# Altium footprint library 封装库.PcbLib: 755 footprints (part 30 of 48)
Each footprint in its own frame and in the unit in brackets; x right, y up, seen from the top. Pads: shape width x height; smd on the part's side, far side on the other; paste and mask are expansions set on the pad; w line width, h text height; cw(c..) or ccw(c..) is an arc to the next point about the centre after c.
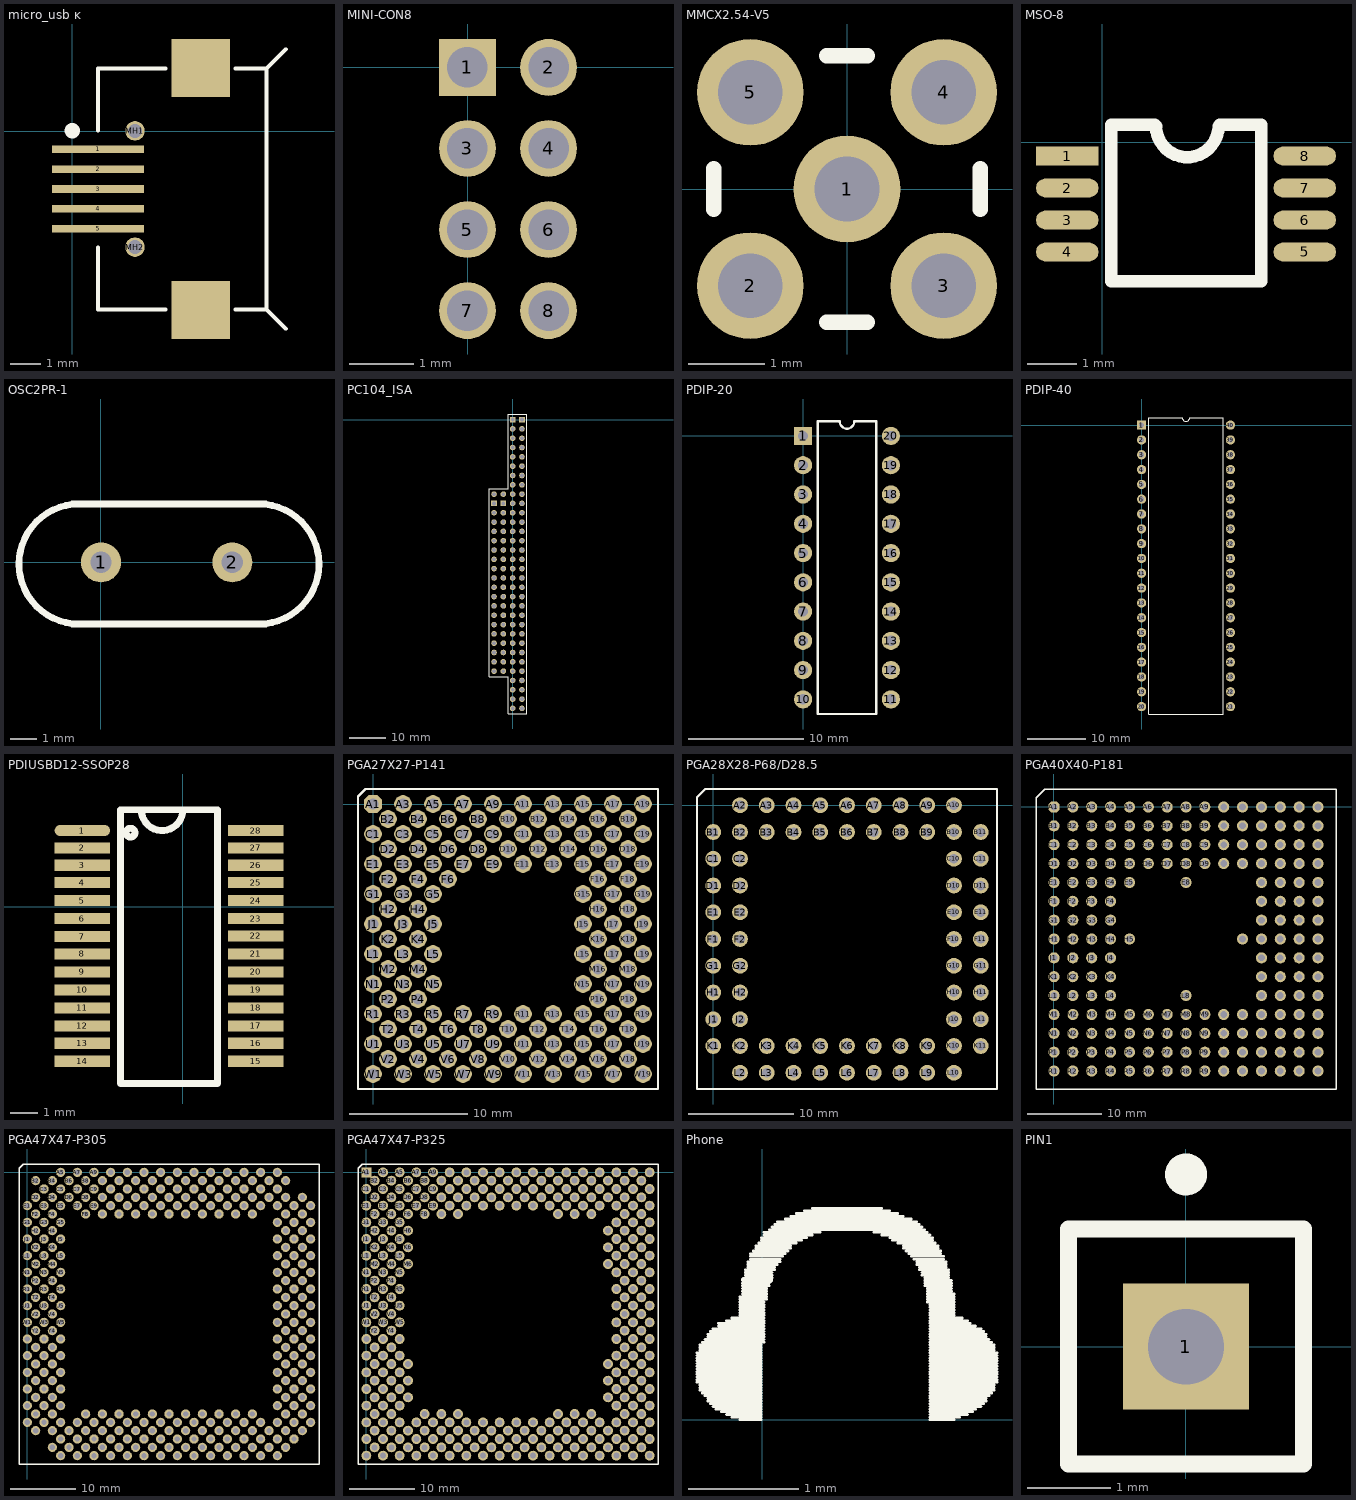
[diagram p29: the footprints below, top view; thin cyan lines are the x and y axes]

## micro_usb ĸ [mm]
pads (9):
  rect 3x0.25 smd: 1(0.842,-0.58) 2(0.842,-1.23) 3(0.842,-1.88) 4(0.842,-2.53) 5(0.842,-3.18)
  round 0.635 hole 0.457 unplated: MH1(2.05,0.02) MH2(2.05,-3.78)
  rect 1.9x1.9 smd: ""(4.2,-5.83) ""(4.2,2.07)
Top Overlay:
  circle w0.25: c0.002,0.025 r0.125
  lines w0.127: 0.842,-5.817 3.048,-5.817 ; 0.842,-5.78 0.842,-3.785 ; 0.842,0.025 0.842,2.02 ; 0.842,2.057 3.048,2.057 ; 5.334,-5.817 6.35,-5.817 6.98,-6.447 ; 5.334,2.057 6.35,2.057 6.98,2.687 ; 6.35,-5.78 6.35,2.02

## MINI-CON8 [mil]
pads (8):
  rect 35x35 hole 25: 1(-0.3,0)
  round 35 hole 25: 2(49.7,0) 3(-0.3,-50) 4(49.7,-50) 5(-0.3,-100) 6(49.7,-100) 7(-0.3,-150) 8(49.7,-150)

## MMCX2.54-V5 [mm] "Connector; RF Coaxial, MMCX, Thru-Hole; 5 Position; Vertical"
height 4.45
pads (5):
  round 1.4 hole 0.85: 1(0,0) 2(-1.27,-1.27) 3(1.27,-1.27) 4(1.27,1.27) 5(-1.27,1.27)
Top Overlay:
  lines w0.2: -1.75,-0.27 -1.75,0.27 ; -0.27,-1.75 0.27,-1.75 ; -0.27,1.75 0.27,1.75 ; 1.75,-0.27 1.75,0.27

## MSO-8 [mil]
pads (8):
  rect 50x15 smd: 1(-28,-11)
  oval 50x15 smd: 2(-28,-36.6) 3(-28,-62.2) 4(-28,-87.8) 5(162,-87.8) 6(162,-62.2) 7(162,-36.6) 8(162,-11)
Top Overlay:
  lines w10: 42,14 7,14 7,-111 127,-111 127,14 94,14 ; 43,13 ccw(c68,13) 93,13

## OSC2PR-1 [mil]
pads (2):
  round 60 hole 32: 1(0.42,-0.46) 2(197.42,-0.46)
Top Overlay:
  lines w10: -42.58,-92.96 247.42,-92.96 ; -42.58,87.04 247.42,87.04 ; -32.58,-92.96 cw(c-32.58,-2.96) -32.58,87.04 ; 237.42,-92.96 ccw(c237.42,-2.96) 237.42,87.04

## PC104_ISA [mil]
pads (104):
  rect 60x60 hole 40: A1(0,0) B1(100,0) C1(-100,-900) D1(-200,-900)
  round 60 hole 40: A2(0,-100) A3(0,-200) A4(0,-300) A5(0,-400) A6(0,-500) A7(0,-600) A8(0,-700) A9(0,-800) A10(0,-900) A11(0,-1000) A12(0,-1100) A13(0,-1200) A14(0,-1300) A15(0,-1400) A16(0,-1500) A17(0,-1600) A18(0,-1700) A19(0,-1800) A20(0,-1900) A21(0,-2000) A22(0,-2100) A23(0,-2200) A24(0,-2300) A25(0,-2400) A26(0,-2500) A27(0,-2600) A28(0,-2700) A29(0,-2800) A30(0,-2900) A31(0,-3000) A32(0,-3100) B2(100,-100) B3(100,-200) B4(100,-300) B5(100,-400) B6(100,-500) B7(100,-600) B8(100,-700) B9(100,-800) B10(100,-900) B11(100,-1000) B12(100,-1100) B13(100,-1200) B14(100,-1300) B15(100,-1400) B16(100,-1500) B17(100,-1600) B18(100,-1700) B19(100,-1800) B20(100,-1900) B21(100,-2000) B22(100,-2100) B23(100,-2200) B24(100,-2300) B25(100,-2400) B26(100,-2500) B27(100,-2600) B28(100,-2700) B29(100,-2800) B30(100,-2900) B31(100,-3000) B32(100,-3100) C0(-100,-800) C2(-100,-1000) C3(-100,-1100) C4(-100,-1200) C5(-100,-1300) C6(-100,-1400) C7(-100,-1500) C8(-100,-1600) C9(-100,-1700) C10(-100,-1800) C11(-100,-1900) C12(-100,-2000) C13(-100,-2100) C14(-100,-2200) C15(-100,-2300) C16(-100,-2400) C17(-100,-2500) C18(-100,-2600) C19(-100,-2700) D0(-200,-800) D2(-200,-1000) D3(-200,-1100) D4(-200,-1200) D5(-200,-1300) D6(-200,-1400) D7(-200,-1500) D8(-200,-1600) D9(-200,-1700) D10(-200,-1800) D11(-200,-1900) D12(-200,-2000) D13(-200,-2100) D14(-200,-2200) D15(-200,-2300) D16(-200,-2400) D17(-200,-2500) D18(-200,-2600) D19(-200,-2700)
Top Overlay:
  lines w10: -250,-2760 -250,-740 -50,-740 -50,60 150,60 150,-3160 -50,-3160 -50,-2760 -250,-2760

## PDIP-20 [mil] "stc"
pads (20):
  rect 62x62 hole 35: 1(0,0)
  round 62 hole 35: 2(0,-100) 3(0,-200) 4(0,-300) 5(0,-400) 6(0,-500) 7(0,-600) 8(0,-700) 9(0,-800) 10(0,-900) 11(300,-900) 12(300,-800) 13(300,-700) 14(300,-600) 15(300,-500) 16(300,-400) 17(300,-300) 18(300,-200) 19(300,-100) 20(300,0)
Top Overlay:
  lines w7.87: 50,-950 250,-950 250,50 175,50 cw(c150,50) 125,50 50,50 50,-950

## PDIP-40 [mil] "stc"
pads (40):
  rect 62x62 hole 35: 1(0,0)
  round 62 hole 35: 2(0,-100) 3(0,-200) 4(0,-300) 5(0,-400) 6(0,-500) 7(0,-600) 8(0,-700) 9(0,-800) 10(0,-900) 11(0,-1000) 12(0,-1100) 13(0,-1200) 14(0,-1300) 15(0,-1400) 16(0,-1500) 17(0,-1600) 18(0,-1700) 19(0,-1800) 20(0,-1900) 21(600,-1900) 22(600,-1800) 23(600,-1700) 24(600,-1600) 25(600,-1500) 26(600,-1400) 27(600,-1300) 28(600,-1200) 29(600,-1100) 30(600,-1000) 31(600,-900) 32(600,-800) 33(600,-700) 34(600,-600) 35(600,-500) 36(600,-400) 37(600,-300) 38(600,-200) 39(600,-100) 40(600,0)
Top Overlay:
  lines w7.87: 50,-1950 550,-1950 550,50 325,50 cw(c300,50) 275,50 50,50 50,-1950

## PDIUSBD12-SSOP28 [mil]
pads (28):
  oval 80x16 smd: 1(-145,110)
  rect 80x16 smd: 2(-145,85) 3(-145,60) 4(-145,35) 5(-145,9) 6(-145,-17) 7(-145,-43) 8(-145,-68) 9(-145,-94) 10(-145,-120) 11(-145,-146) 12(-145,-172) 13(-145,-197) 14(-145,-223) 15(105,-223) 16(105,-197) 17(105,-172) 18(105,-146) 19(105,-120) 20(105,-94) 21(105,-68) 22(105,-42) 23(105,-17) 24(105,9) 25(105,35) 26(105,60) 27(105,85) 28(105,110)
Top Overlay:
  circle w10: c-75.56,106.98 r6.41
  lines w10: -60,140 ccw(c-30,140) 0,140 ; -90,-255 50,-255 50,140 -90,140 -90,-255

## PGA27X27-P141 [mm]
pads (141):
  oct 1.5x1.5 hole 0.9: A1(0,0)
  round 1.5 hole 0.9: A3(2.54,0) A5(5.08,0) A7(7.62,0) A9(10.16,0) A11(12.7,0) A13(15.24,0) A15(17.78,0) A17(20.32,0) A19(22.86,0) B2(1.27,-1.27) B4(3.81,-1.27) B6(6.35,-1.27) B8(8.89,-1.27) B10(11.43,-1.27) B12(13.97,-1.27) B14(16.51,-1.27) B16(19.05,-1.27) B18(21.59,-1.27) C1(0,-2.54) C3(2.54,-2.54) C5(5.08,-2.54) C7(7.62,-2.54) C9(10.16,-2.54) C11(12.7,-2.54) C13(15.24,-2.54) C15(17.78,-2.54) C17(20.32,-2.54) C19(22.86,-2.54) D2(1.27,-3.81) D4(3.81,-3.81) D6(6.35,-3.81) D8(8.89,-3.81) D10(11.43,-3.81) D12(13.97,-3.81) D14(16.51,-3.81) D16(19.05,-3.81) D18(21.59,-3.81) E1(0,-5.08) E3(2.54,-5.08) E5(5.08,-5.08) E7(7.62,-5.08) E9(10.16,-5.08) E11(12.7,-5.08) E13(15.24,-5.08) E15(17.78,-5.08) E17(20.32,-5.08) E19(22.86,-5.08) F2(1.27,-6.35) F4(3.81,-6.35) F6(6.35,-6.35) F16(19.05,-6.35) F18(21.59,-6.35) G1(0,-7.62) G3(2.54,-7.62) G5(5.08,-7.62) G15(17.78,-7.62) G17(20.32,-7.62) G19(22.86,-7.62) H2(1.27,-8.89) H4(3.81,-8.89) H16(19.05,-8.89) H18(21.59,-8.89) J1(0,-10.16) J3(2.54,-10.16) J5(5.08,-10.16) J15(17.78,-10.16) J17(20.32,-10.16) J19(22.86,-10.16) K2(1.27,-11.43) K4(3.81,-11.43) K16(19.05,-11.43) K18(21.59,-11.43) L1(0,-12.7) L3(2.54,-12.7) L5(5.08,-12.7) L15(17.78,-12.7) L17(20.32,-12.7) L19(22.86,-12.7) M2(1.27,-13.97) M4(3.81,-13.97) M16(19.05,-13.97) M18(21.59,-13.97) N1(0,-15.24) N3(2.54,-15.24) N5(5.08,-15.24) N15(17.78,-15.24) N17(20.32,-15.24) N19(22.86,-15.24) P2(1.27,-16.51) P4(3.81,-16.51) P16(19.05,-16.51) P18(21.59,-16.51) R1(0,-17.78) R3(2.54,-17.78) R5(5.08,-17.78) R7(7.62,-17.78) R9(10.16,-17.78) R11(12.7,-17.78) R13(15.24,-17.78) R15(17.78,-17.78) R17(20.32,-17.78) R19(22.86,-17.78) T2(1.27,-19.05) T4(3.81,-19.05) T6(6.35,-19.05) T8(8.89,-19.05) T10(11.43,-19.05) T12(13.97,-19.05) T14(16.51,-19.05) T16(19.05,-19.05) T18(21.59,-19.05) U1(0,-20.32) U3(2.54,-20.32) U5(5.08,-20.32) U7(7.62,-20.32) U9(10.16,-20.32) U11(12.7,-20.32) U13(15.24,-20.32) U15(17.78,-20.32) U17(20.32,-20.32) U19(22.86,-20.32) V2(1.27,-21.59) V4(3.81,-21.59) V6(6.35,-21.59) V8(8.89,-21.59) V10(11.43,-21.59) V12(13.97,-21.59) V14(16.51,-21.59) V16(19.05,-21.59) V18(21.59,-21.59) W1(0,-22.86) W3(2.54,-22.86) W5(5.08,-22.86) W7(7.62,-22.86) W9(10.16,-22.86) W11(12.7,-22.86) W13(15.24,-22.86) W15(17.78,-22.86) W17(20.32,-22.86) W19(22.86,-22.86)
Top Overlay:
  lines w0.2: -1.27,-24.13 -1.27,0.635 -0.635,1.27 24.13,1.27 24.13,-24.13 -1.27,-24.13

## PGA28X28-P68/D28.5 [mm]
pads (68):
  round 1.5 hole 0.9: A2(2.54,0) A3(5.08,0) A4(7.62,0) A5(10.16,0) A6(12.7,0) A7(15.24,0) A8(17.78,0) A9(20.32,0) A10(22.86,0) B1(0,-2.54) B2(2.54,-2.54) B3(5.08,-2.54) B4(7.62,-2.54) B5(10.16,-2.54) B6(12.7,-2.54) B7(15.24,-2.54) B8(17.78,-2.54) B9(20.32,-2.54) B10(22.86,-2.54) B11(25.4,-2.54) C1(0,-5.08) C2(2.54,-5.08) C10(22.86,-5.08) C11(25.4,-5.08) D1(0,-7.62) D2(2.54,-7.62) D10(22.86,-7.62) D11(25.4,-7.62) E1(0,-10.16) E2(2.54,-10.16) E10(22.86,-10.16) E11(25.4,-10.16) F1(0,-12.7) F2(2.54,-12.7) F10(22.86,-12.7) F11(25.4,-12.7) G1(0,-15.24) G2(2.54,-15.24) G10(22.86,-15.24) G11(25.4,-15.24) H1(0,-17.78) H2(2.54,-17.78) H10(22.86,-17.78) H11(25.4,-17.78) J1(0,-20.32) J2(2.54,-20.32) J10(22.86,-20.32) J11(25.4,-20.32) K1(0,-22.86) K2(2.54,-22.86) K3(5.08,-22.86) K4(7.62,-22.86) K5(10.16,-22.86) K6(12.7,-22.86) K7(15.24,-22.86) K8(17.78,-22.86) K9(20.32,-22.86) K10(22.86,-22.86) K11(25.4,-22.86) L2(2.54,-25.4) L3(5.08,-25.4) L4(7.62,-25.4) L5(10.16,-25.4) L6(12.7,-25.4) L7(15.24,-25.4) L8(17.78,-25.4) L9(20.32,-25.4) L10(22.86,-25.4)
Top Overlay:
  lines w0.2: -1.55,-26.95 -1.55,0.775 -0.775,1.55 26.95,1.55 26.95,-26.95 -1.55,-26.95

## PGA40X40-P181 [mm]
pads (181):
  oct 1.5x1.5 hole 0.9: A1(0,0)
  round 1.5 hole 0.9: A2(2.54,0) A3(5.08,0) A4(7.62,0) A5(10.16,0) A6(12.7,0) A7(15.24,0) A8(17.78,0) A9(20.32,0) A10(22.86,0) A11(25.4,0) A12(27.94,0) A13(30.48,0) A14(33.02,0) A15(35.56,0) B1(0,-2.54) B2(2.54,-2.54) B3(5.08,-2.54) B4(7.62,-2.54) B5(10.16,-2.54) B6(12.7,-2.54) B7(15.24,-2.54) B8(17.78,-2.54) B9(20.32,-2.54) B10(22.86,-2.54) B11(25.4,-2.54) B12(27.94,-2.54) B13(30.48,-2.54) B14(33.02,-2.54) B15(35.56,-2.54) C1(0,-5.08) C2(2.54,-5.08) C3(5.08,-5.08) C4(7.62,-5.08) C5(10.16,-5.08) C6(12.7,-5.08) C7(15.24,-5.08) C8(17.78,-5.08) C9(20.32,-5.08) C10(22.86,-5.08) C11(25.4,-5.08) C12(27.94,-5.08) C13(30.48,-5.08) C14(33.02,-5.08) C15(35.56,-5.08) D1(0,-7.62) D2(2.54,-7.62) D3(5.08,-7.62) D4(7.62,-7.62) D5(10.16,-7.62) D6(12.7,-7.62) D7(15.24,-7.62) D8(17.78,-7.62) D9(20.32,-7.62) D10(22.86,-7.62) D11(25.4,-7.62) D12(27.94,-7.62) D13(30.48,-7.62) D14(33.02,-7.62) D15(35.56,-7.62) E1(0,-10.16) E2(2.54,-10.16) E3(5.08,-10.16) E4(7.62,-10.16) E5(10.16,-10.16) E8(17.78,-10.16) E12(27.94,-10.16) E13(30.48,-10.16) E14(33.02,-10.16) E15(35.56,-10.16) F1(0,-12.7) F2(2.54,-12.7) F3(5.08,-12.7) F4(7.62,-12.7) F12(27.94,-12.7) F13(30.48,-12.7) F14(33.02,-12.7) F15(35.56,-12.7) G1(0,-15.24) G2(2.54,-15.24) G3(5.08,-15.24) G4(7.62,-15.24) G12(27.94,-15.24) G13(30.48,-15.24) G14(33.02,-15.24) G15(35.56,-15.24) H1(0,-17.78) H2(2.54,-17.78) H3(5.08,-17.78) H4(7.62,-17.78) H5(10.16,-17.78) H11(25.4,-17.78) H12(27.94,-17.78) H13(30.48,-17.78) H14(33.02,-17.78) H15(35.56,-17.78) J1(0,-20.32) J2(2.54,-20.32) J3(5.08,-20.32) J4(7.62,-20.32) J12(27.94,-20.32) J13(30.48,-20.32) J14(33.02,-20.32) J15(35.56,-20.32) K1(0,-22.86) K2(2.54,-22.86) K3(5.08,-22.86) K4(7.62,-22.86) K12(27.94,-22.86) K13(30.48,-22.86) K14(33.02,-22.86) K15(35.56,-22.86) L1(0,-25.4) L2(2.54,-25.4) L3(5.08,-25.4) L4(7.62,-25.4) L8(17.78,-25.4) L12(27.94,-25.4) L13(30.48,-25.4) L14(33.02,-25.4) L15(35.56,-25.4) M1(0,-27.94) M2(2.54,-27.94) M3(5.08,-27.94) M4(7.62,-27.94) M5(10.16,-27.94) M6(12.7,-27.94) M7(15.24,-27.94) M8(17.78,-27.94) M9(20.32,-27.94) M10(22.86,-27.94) M11(25.4,-27.94) M12(27.94,-27.94) M13(30.48,-27.94) M14(33.02,-27.94) M15(35.56,-27.94) N1(0,-30.48) N2(2.54,-30.48) N3(5.08,-30.48) N4(7.62,-30.48) N5(10.16,-30.48) N6(12.7,-30.48) N7(15.24,-30.48) N8(17.78,-30.48) N9(20.32,-30.48) N10(22.86,-30.48) N11(25.4,-30.48) N12(27.94,-30.48) N13(30.48,-30.48) N14(33.02,-30.48) N15(35.56,-30.48) P1(0,-33.02) P2(2.54,-33.02) P3(5.08,-33.02) P4(7.62,-33.02) P5(10.16,-33.02) P6(12.7,-33.02) P7(15.24,-33.02) P8(17.78,-33.02) P9(20.32,-33.02) P10(22.86,-33.02) P11(25.4,-33.02) P12(27.94,-33.02) P13(30.48,-33.02) P14(33.02,-33.02) P15(35.56,-33.02) R1(0,-35.56) R2(2.54,-35.56) R3(5.08,-35.56) R4(7.62,-35.56) R5(10.16,-35.56) R6(12.7,-35.56) R7(15.24,-35.56) R8(17.78,-35.56) R9(20.32,-35.56) R10(22.86,-35.56) R11(25.4,-35.56) R12(27.94,-35.56) R13(30.48,-35.56) R14(33.02,-35.56) R15(35.56,-35.56)
Top Overlay:
  lines w0.2: -2.42,-37.98 -2.42,1.21 -1.21,2.42 37.98,2.42 37.98,-37.98 -2.42,-37.98

## PGA47X47-P305 [mm]
pads (305):
  round 1.4 hole 0.8: A5(5.08,0) A7(7.62,0) A9(10.16,0) A11(12.7,0) A13(15.24,0) A15(17.78,0) A17(20.32,0) A19(22.86,0) A21(25.4,0) A23(27.94,0) A25(30.48,0) A27(33.02,0) A29(35.56,0) A31(38.1,0) AA1(0,-25.4) AA3(2.54,-25.4) AA5(5.08,-25.4) AA31(38.1,-25.4) AA33(40.64,-25.4) AA35(43.18,-25.4) AB2(1.27,-26.67) AB4(3.81,-26.67) AB32(39.37,-26.67) AB34(41.91,-26.67) AC1(0,-27.94) AC3(2.54,-27.94) AC5(5.08,-27.94) AC31(38.1,-27.94) AC33(40.64,-27.94) AC35(43.18,-27.94) AD2(1.27,-29.21) AD4(3.81,-29.21) AD32(39.37,-29.21) AD34(41.91,-29.21) AE1(0,-30.48) AE3(2.54,-30.48) AE5(5.08,-30.48) AE31(38.1,-30.48) AE33(40.64,-30.48) AE35(43.18,-30.48) AF2(1.27,-31.75) AF4(3.81,-31.75) AF32(39.37,-31.75) AF34(41.91,-31.75) AG1(0,-33.02) AG3(2.54,-33.02) AG5(5.08,-33.02) AG31(38.1,-33.02) AG33(40.64,-33.02) AG35(43.18,-33.02) AH2(1.27,-34.29) AH4(3.81,-34.29) AH32(39.37,-34.29) AH34(41.91,-34.29) AJ1(0,-35.56) AJ3(2.54,-35.56) AJ5(5.08,-35.56) AJ31(38.1,-35.56) AJ33(40.64,-35.56) AJ35(43.18,-35.56) AK2(1.27,-36.83) AK4(3.81,-36.83) AK8(8.89,-36.83) AK10(11.43,-36.83) AK12(13.97,-36.83) AK14(16.51,-36.83) AK16(19.05,-36.83) AK18(21.59,-36.83) AK20(24.13,-36.83) AK22(26.67,-36.83) AK24(29.21,-36.83) AK26(31.75,-36.83) AK28(34.29,-36.83) AK32(39.37,-36.83) AK34(41.91,-36.83) AL1(0,-38.1) AL3(2.54,-38.1) AL5(5.08,-38.1) AL7(7.62,-38.1) AL9(10.16,-38.1) AL11(12.7,-38.1) AL13(15.24,-38.1) AL15(17.78,-38.1) AL17(20.32,-38.1) AL19(22.86,-38.1) AL21(25.4,-38.1) AL23(27.94,-38.1) AL25(30.48,-38.1) AL27(33.02,-38.1) AL29(35.56,-38.1) AL31(38.1,-38.1) AL33(40.64,-38.1) AL35(43.18,-38.1) AM2(1.27,-39.37) AM4(3.81,-39.37) AM6(6.35,-39.37) AM8(8.89,-39.37) AM10(11.43,-39.37) AM12(13.97,-39.37) AM14(16.51,-39.37) AM16(19.05,-39.37) AM18(21.59,-39.37) AM20(24.13,-39.37) AM22(26.67,-39.37) AM24(29.21,-39.37) AM26(31.75,-39.37) AM28(34.29,-39.37) AM30(36.83,-39.37) AM32(39.37,-39.37) AM34(41.91,-39.37) AN5(5.08,-40.64) AN7(7.62,-40.64) AN9(10.16,-40.64) AN11(12.7,-40.64) AN13(15.24,-40.64) AN15(17.78,-40.64) AN17(20.32,-40.64) AN19(22.86,-40.64) AN21(25.4,-40.64) AN23(27.94,-40.64) AN25(30.48,-40.64) AN27(33.02,-40.64) AN29(35.56,-40.64) AN31(38.1,-40.64) AN33(40.64,-40.64) AP4(3.81,-41.91) AP6(6.35,-41.91) AP8(8.89,-41.91) AP10(11.43,-41.91) AP12(13.97,-41.91) AP14(16.51,-41.91) AP16(19.05,-41.91) AP18(21.59,-41.91) AP20(24.13,-41.91) AP22(26.67,-41.91) AP24(29.21,-41.91) AP26(31.75,-41.91) AP28(34.29,-41.91) AP30(36.83,-41.91) AP32(39.37,-41.91) AR5(5.08,-43.18) AR7(7.62,-43.18) AR9(10.16,-43.18) AR11(12.7,-43.18) AR13(15.24,-43.18) AR15(17.78,-43.18) AR17(20.32,-43.18) AR19(22.86,-43.18) AR21(25.4,-43.18) AR23(27.94,-43.18) AR25(30.48,-43.18) AR27(33.02,-43.18) AR29(35.56,-43.18) AR31(38.1,-43.18) B2(1.27,-1.27) B4(3.81,-1.27) B6(6.35,-1.27) B8(8.89,-1.27) B10(11.43,-1.27) B12(13.97,-1.27) B14(16.51,-1.27) B16(19.05,-1.27) B18(21.59,-1.27) B20(24.13,-1.27) B22(26.67,-1.27) B24(29.21,-1.27) B26(31.75,-1.27) B28(34.29,-1.27) B30(36.83,-1.27) B32(39.37,-1.27) C3(2.54,-2.54) C5(5.08,-2.54) C7(7.62,-2.54) C9(10.16,-2.54) C11(12.7,-2.54) C13(15.24,-2.54) C15(17.78,-2.54) C17(20.32,-2.54) C19(22.86,-2.54) C21(25.4,-2.54) C23(27.94,-2.54) C25(30.48,-2.54) C27(33.02,-2.54) C29(35.56,-2.54) C31(38.1,-2.54) D2(1.27,-3.81) D4(3.81,-3.81) D6(6.35,-3.81) D8(8.89,-3.81) D10(11.43,-3.81) D12(13.97,-3.81) D14(16.51,-3.81) D16(19.05,-3.81) D18(21.59,-3.81) D20(24.13,-3.81) D22(26.67,-3.81) D24(29.21,-3.81) D26(31.75,-3.81) D28(34.29,-3.81) D30(36.83,-3.81) D32(39.37,-3.81) D34(41.91,-3.81) E1(0,-5.08) E3(2.54,-5.08) E5(5.08,-5.08) E7(7.62,-5.08) E9(10.16,-5.08) E11(12.7,-5.08) E13(15.24,-5.08) E15(17.78,-5.08) E17(20.32,-5.08) E19(22.86,-5.08) E21(25.4,-5.08) E23(27.94,-5.08) E25(30.48,-5.08) E27(33.02,-5.08) E29(35.56,-5.08) E31(38.1,-5.08) E33(40.64,-5.08) E35(43.18,-5.08) F2(1.27,-6.35) F4(3.81,-6.35) F8(8.89,-6.35) F10(11.43,-6.35) F12(13.97,-6.35) F14(16.51,-6.35) F16(19.05,-6.35) F18(21.59,-6.35) F20(24.13,-6.35) F22(26.67,-6.35) F24(29.21,-6.35) F26(31.75,-6.35) F28(34.29,-6.35) F32(39.37,-6.35) F34(41.91,-6.35) G1(0,-7.62) G3(2.54,-7.62) G5(5.08,-7.62) G31(38.1,-7.62) G33(40.64,-7.62) G35(43.18,-7.62) H2(1.27,-8.89) H4(3.81,-8.89) H32(39.37,-8.89) H34(41.91,-8.89) J1(0,-10.16) J3(2.54,-10.16) J5(5.08,-10.16) J31(38.1,-10.16) J33(40.64,-10.16) J35(43.18,-10.16) K2(1.27,-11.43) K4(3.81,-11.43) K32(39.37,-11.43) K34(41.91,-11.43) L1(0,-12.7) L3(2.54,-12.7) L5(5.08,-12.7) L31(38.1,-12.7) L33(40.64,-12.7) L35(43.18,-12.7) M2(1.27,-13.97) M4(3.81,-13.97) M32(39.37,-13.97) M34(41.91,-13.97) N1(0,-15.24) N3(2.54,-15.24) N5(5.08,-15.24) N31(38.1,-15.24) N33(40.64,-15.24) N35(43.18,-15.24) P2(1.27,-16.51) P4(3.81,-16.51) P32(39.37,-16.51) P34(41.91,-16.51) R1(0,-17.78) R3(2.54,-17.78) R5(5.08,-17.78) R31(38.1,-17.78) R33(40.64,-17.78) R35(43.18,-17.78) T2(1.27,-19.05) T4(3.81,-19.05) T32(39.37,-19.05) T34(41.91,-19.05) U1(0,-20.32) U3(2.54,-20.32) U5(5.08,-20.32) U31(38.1,-20.32) U33(40.64,-20.32) U35(43.18,-20.32) V2(1.27,-21.59) V4(3.81,-21.59) V32(39.37,-21.59) V34(41.91,-21.59) W1(0,-22.86) W3(2.54,-22.86) W5(5.08,-22.86) W31(38.1,-22.86) W33(40.64,-22.86) W35(43.18,-22.86) Y2(1.27,-24.13) Y4(3.81,-24.13) Y32(39.37,-24.13) Y34(41.91,-24.13)
Top Overlay:
  lines w0.2: -1.27,-44.45 -1.27,0.635 -0.635,1.27 44.45,1.27 44.45,-44.45 -1.27,-44.45

## PGA47X47-P325 [mm]
pads (325):
  rect 1.5x1.5 hole 0.9: A1(0,0)
  round 1.5 hole 0.9: A3(2.54,0) A5(5.08,0) A7(7.62,0) A9(10.16,0) A11(12.7,0) A13(15.24,0) A15(17.78,0) A17(20.32,0) A19(22.86,0) A21(25.4,0) A23(27.94,0) A25(30.48,0) A27(33.02,0) A29(35.56,0) A31(38.1,0) A33(40.64,0) A35(43.18,0) AA1(0,-25.4) AA3(2.54,-25.4) AA5(5.08,-25.4) AA31(38.1,-25.4) AA33(40.64,-25.4) AA35(43.18,-25.4) AB2(1.27,-26.67) AB4(3.81,-26.67) AB32(39.37,-26.67) AB34(41.91,-26.67) AC1(0,-27.94) AC3(2.54,-27.94) AC5(5.08,-27.94) AC31(38.1,-27.94) AC33(40.64,-27.94) AC35(43.18,-27.94) AD2(1.27,-29.21) AD4(3.81,-29.21) AD6(6.35,-29.21) AD30(36.83,-29.21) AD32(39.37,-29.21) AD34(41.91,-29.21) AE1(0,-30.48) AE3(2.54,-30.48) AE5(5.08,-30.48) AE31(38.1,-30.48) AE33(40.64,-30.48) AE35(43.18,-30.48) AF2(1.27,-31.75) AF4(3.81,-31.75) AF6(6.35,-31.75) AF30(36.83,-31.75) AF32(39.37,-31.75) AF34(41.91,-31.75) AG1(0,-33.02) AG3(2.54,-33.02) AG5(5.08,-33.02) AG31(38.1,-33.02) AG33(40.64,-33.02) AG35(43.18,-33.02) AH2(1.27,-34.29) AH4(3.81,-34.29) AH6(6.35,-34.29) AH30(36.83,-34.29) AH32(39.37,-34.29) AH34(41.91,-34.29) AJ1(0,-35.56) AJ3(2.54,-35.56) AJ5(5.08,-35.56) AJ31(38.1,-35.56) AJ33(40.64,-35.56) AJ35(43.18,-35.56) AK2(1.27,-36.83) AK4(3.81,-36.83) AK8(8.89,-36.83) AK10(11.43,-36.83) AK12(13.97,-36.83) AK24(29.21,-36.83) AK26(31.75,-36.83) AK28(34.29,-36.83) AK32(39.37,-36.83) AK34(41.91,-36.83) AL1(0,-38.1) AL3(2.54,-38.1) AL5(5.08,-38.1) AL7(7.62,-38.1) AL9(10.16,-38.1) AL11(12.7,-38.1) AL13(15.24,-38.1) AL15(17.78,-38.1) AL17(20.32,-38.1) AL19(22.86,-38.1) AL21(25.4,-38.1) AL23(27.94,-38.1) AL25(30.48,-38.1) AL27(33.02,-38.1) AL29(35.56,-38.1) AL31(38.1,-38.1) AL33(40.64,-38.1) AL35(43.18,-38.1) AM2(1.27,-39.37) AM4(3.81,-39.37) AM6(6.35,-39.37) AM8(8.89,-39.37) AM10(11.43,-39.37) AM12(13.97,-39.37) AM14(16.51,-39.37) AM16(19.05,-39.37) AM18(21.59,-39.37) AM20(24.13,-39.37) AM22(26.67,-39.37) AM24(29.21,-39.37) AM26(31.75,-39.37) AM28(34.29,-39.37) AM30(36.83,-39.37) AM32(39.37,-39.37) AM34(41.91,-39.37) AN1(0,-40.64) AN3(2.54,-40.64) AN5(5.08,-40.64) AN7(7.62,-40.64) AN9(10.16,-40.64) AN11(12.7,-40.64) AN13(15.24,-40.64) AN15(17.78,-40.64) AN17(20.32,-40.64) AN19(22.86,-40.64) AN21(25.4,-40.64) AN23(27.94,-40.64) AN25(30.48,-40.64) AN27(33.02,-40.64) AN29(35.56,-40.64) AN31(38.1,-40.64) AN33(40.64,-40.64) AN35(43.18,-40.64) AP2(1.27,-41.91) AP4(3.81,-41.91) AP6(6.35,-41.91) AP8(8.89,-41.91) AP10(11.43,-41.91) AP12(13.97,-41.91) AP14(16.51,-41.91) AP16(19.05,-41.91) AP18(21.59,-41.91) AP20(24.13,-41.91) AP22(26.67,-41.91) AP24(29.21,-41.91) AP26(31.75,-41.91) AP28(34.29,-41.91) AP30(36.83,-41.91) AP32(39.37,-41.91) AP34(41.91,-41.91) AR1(0,-43.18) AR3(2.54,-43.18) AR5(5.08,-43.18) AR7(7.62,-43.18) AR9(10.16,-43.18) AR11(12.7,-43.18) AR13(15.24,-43.18) AR15(17.78,-43.18) AR17(20.32,-43.18) AR19(22.86,-43.18) AR21(25.4,-43.18) AR23(27.94,-43.18) AR25(30.48,-43.18) AR27(33.02,-43.18) AR29(35.56,-43.18) AR31(38.1,-43.18) AR33(40.64,-43.18) AR35(43.18,-43.18) B2(1.27,-1.27) B4(3.81,-1.27) B6(6.35,-1.27) B8(8.89,-1.27) B10(11.43,-1.27) B12(13.97,-1.27) B14(16.51,-1.27) B16(19.05,-1.27) B18(21.59,-1.27) B20(24.13,-1.27) B22(26.67,-1.27) B24(29.21,-1.27) B26(31.75,-1.27) B28(34.29,-1.27) B30(36.83,-1.27) B32(39.37,-1.27) B34(41.91,-1.27) C1(0,-2.54) C3(2.54,-2.54) C5(5.08,-2.54) C7(7.62,-2.54) C9(10.16,-2.54) C11(12.7,-2.54) C13(15.24,-2.54) C15(17.78,-2.54) C17(20.32,-2.54) C19(22.86,-2.54) C21(25.4,-2.54) C23(27.94,-2.54) C25(30.48,-2.54) C27(33.02,-2.54) C29(35.56,-2.54) C31(38.1,-2.54) C33(40.64,-2.54) C35(43.18,-2.54) D2(1.27,-3.81) D4(3.81,-3.81) D6(6.35,-3.81) D8(8.89,-3.81) D10(11.43,-3.81) D12(13.97,-3.81) D14(16.51,-3.81) D16(19.05,-3.81) D18(21.59,-3.81) D20(24.13,-3.81) D22(26.67,-3.81) D24(29.21,-3.81) D26(31.75,-3.81) D28(34.29,-3.81) D30(36.83,-3.81) D32(39.37,-3.81) D34(41.91,-3.81) E1(0,-5.08) E3(2.54,-5.08) E5(5.08,-5.08) E7(7.62,-5.08) E9(10.16,-5.08) E11(12.7,-5.08) E13(15.24,-5.08) E15(17.78,-5.08) E17(20.32,-5.08) E19(22.86,-5.08) E21(25.4,-5.08) E23(27.94,-5.08) E25(30.48,-5.08) E27(33.02,-5.08) E29(35.56,-5.08) E31(38.1,-5.08) E33(40.64,-5.08) E35(43.18,-5.08) F2(1.27,-6.35) F4(3.81,-6.35) F6(6.35,-6.35) F8(8.89,-6.35) F10(11.43,-6.35) F12(13.97,-6.35) F24(29.21,-6.35) F26(31.75,-6.35) F28(34.29,-6.35) F32(39.37,-6.35) F34(41.91,-6.35) G1(0,-7.62) G3(2.54,-7.62) G5(5.08,-7.62) G31(38.1,-7.62) G33(40.64,-7.62) G35(43.18,-7.62) H2(1.27,-8.89) H4(3.81,-8.89) H6(6.35,-8.89) H30(36.83,-8.89) H32(39.37,-8.89) H34(41.91,-8.89) J1(0,-10.16) J3(2.54,-10.16) J5(5.08,-10.16) J31(38.1,-10.16) J33(40.64,-10.16) J35(43.18,-10.16) K2(1.27,-11.43) K4(3.81,-11.43) K6(6.35,-11.43) K30(36.83,-11.43) K32(39.37,-11.43) K34(41.91,-11.43) L1(0,-12.7) L3(2.54,-12.7) L5(5.08,-12.7) L31(38.1,-12.7) L33(40.64,-12.7) L35(43.18,-12.7) M2(1.27,-13.97) M4(3.81,-13.97) M6(6.35,-13.97) M30(36.83,-13.97) M32(39.37,-13.97) M34(41.91,-13.97) N1(0,-15.24) N3(2.54,-15.24) N5(5.08,-15.24) N31(38.1,-15.24) N33(40.64,-15.24) N35(43.18,-15.24) P2(1.27,-16.51) P4(3.81,-16.51) P32(39.37,-16.51) P34(41.91,-16.51) R1(0,-17.78) R3(2.54,-17.78) R5(5.08,-17.78) R31(38.1,-17.78) R33(40.64,-17.78) R35(43.18,-17.78) T2(1.27,-19.05) T4(3.81,-19.05) T32(39.37,-19.05) T34(41.91,-19.05) U1(0,-20.32) U3(2.54,-20.32) U5(5.08,-20.32) U31(38.1,-20.32) U33(40.64,-20.32) U35(43.18,-20.32) V2(1.27,-21.59) V4(3.81,-21.59) V32(39.37,-21.59) V34(41.91,-21.59) W1(0,-22.86) W3(2.54,-22.86) W5(5.08,-22.86) W31(38.1,-22.86) W33(40.64,-22.86) W35(43.18,-22.86) Y2(1.27,-24.13) Y4(3.81,-24.13) Y32(39.37,-24.13) Y34(41.91,-24.13)
Top Overlay:
  lines w0.2: -1.27,-44.45 44.45,-44.45 44.45,1.27 -0.635,1.27 -1.27,0.635 -1.27,-44.45

## Phone [mm]
Top Overlay:
  drawing of 151 lines, arcs and shapes, not listed

## PIN1 [mm] "Connector; Plug"
pads (1):
  rect 1.5x1.5 hole 0.9: 1(0,0)
Top Overlay:
  circle w0.25: c0,2.05 r0.125
  lines w0.2: -1.4,-1.4 1.4,-1.4 1.4,1.4 -1.4,1.4 -1.4,-1.4